# Altium schematic symbol library Блоки трансформаторов импульсных.SCHLIB: 325 symbols (part 1 of 2) (continued)
## БТИ2-10 (continued)
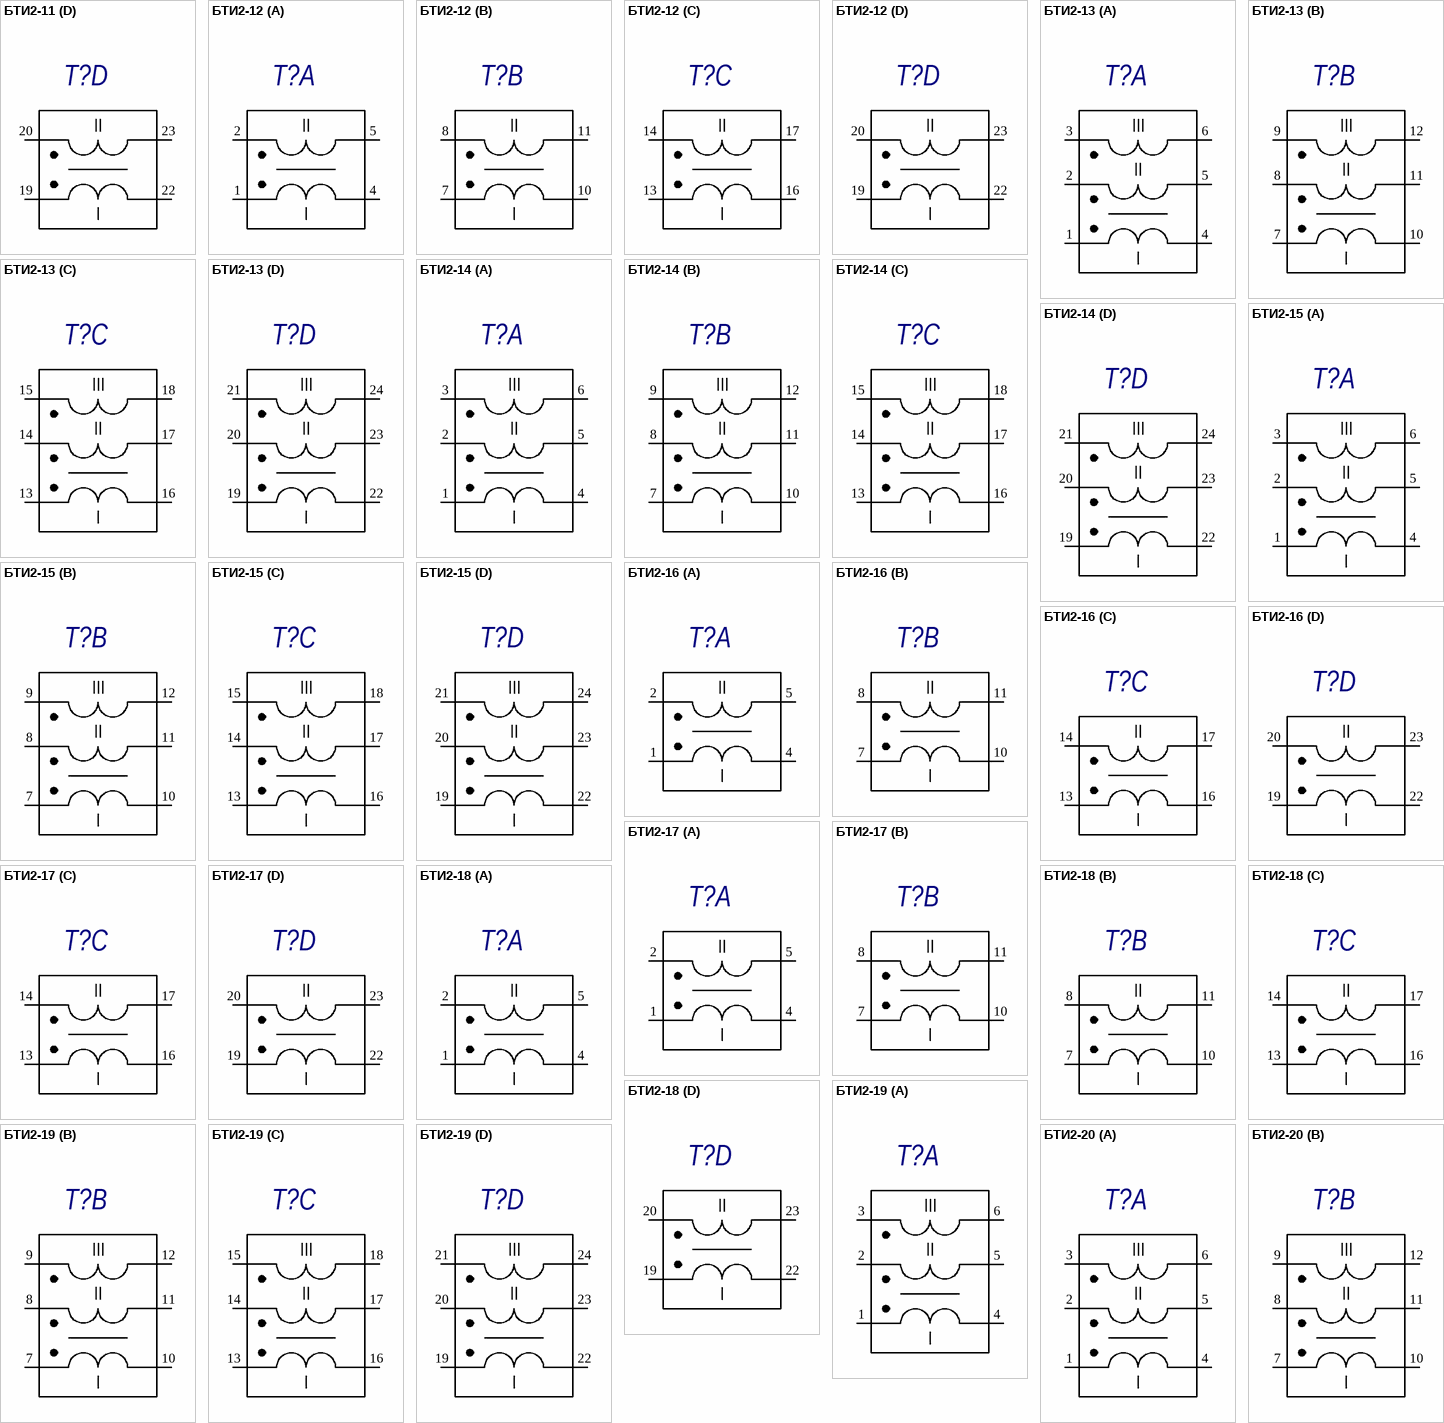
[diagram p5: symbols БТИ2-11 to БТИ2-20]
part A text: II; I
part B text: II; I
part C text: II; I
part D text: II; I

## БТИ2-11
designator T?
БТИ2; Manufacturer: ПАО  «МСТАТОР»; ManufacturerCountry: Россия; Value: {Value}; Наименование элемента: Дроссель; Category: Трансформатор; ComponentLink1Description: Manufacturer Link
footprint БТИ2
part A pins: 1, 2, 4, 5
part B pins: 7, 8, 10, 11
part C pins: 13, 14, 16, 17
part D pins: 19, 20, 22, 23
part A text: II; I
part B text: II; I
part C text: II; I
part D text: II; I

## БТИ2-12
designator T?
БТИ2; Manufacturer: ПАО  «МСТАТОР»; ManufacturerCountry: Россия; Value: {Value}; Наименование элемента: Дроссель; Category: Трансформатор; ComponentLink1Description: Manufacturer Link
footprint БТИ2
part A pins: 1, 2, 4, 5
part B pins: 7, 8, 10, 11
part C pins: 13, 14, 16, 17
part D pins: 19, 20, 22, 23
part A text: II; I
part B text: II; I
part C text: II; I
part D text: II; I

## БТИ2-13
designator T?
БТИ2; Manufacturer: ПАО  «МСТАТОР»; ManufacturerCountry: Россия; Value: {Value}; Наименование элемента: Дроссель; Category: Трансформатор; ComponentLink1Description: Manufacturer Link
footprint БТИ2
part A pins: 1, 2, 3, 4, 5, 6
part B pins: 7, 8, 9, 10, 11, 12
part C pins: 13, 14, 15, 16, 17, 18
part D pins: 19, 20, 21, 22, 23, 24
part A text: III; II; I
part B text: III; II; I
part C text: III; II; I
part D text: III; II; I

## БТИ2-14
designator T?
БТИ2; Manufacturer: ПАО  «МСТАТОР»; ManufacturerCountry: Россия; Value: {Value}; Наименование элемента: Дроссель; Category: Трансформатор; ComponentLink1Description: Manufacturer Link
footprint БТИ2
part A pins: 1, 2, 3, 4, 5, 6
part B pins: 7, 8, 9, 10, 11, 12
part C pins: 13, 14, 15, 16, 17, 18
part D pins: 19, 20, 21, 22, 23, 24
part A text: III; II; I
part B text: III; II; I
part C text: III; II; I
part D text: III; II; I

## БТИ2-15
designator T?
БТИ2; Manufacturer: ПАО  «МСТАТОР»; ManufacturerCountry: Россия; Value: {Value}; Наименование элемента: Дроссель; Category: Трансформатор; ComponentLink1Description: Manufacturer Link
footprint БТИ2
part A pins: 1, 2, 3, 4, 5, 6
part B pins: 7, 8, 9, 10, 11, 12
part C pins: 13, 14, 15, 16, 17, 18
part D pins: 19, 20, 21, 22, 23, 24
part A text: III; II; I
part B text: III; II; I
part C text: III; II; I
part D text: III; II; I

## БТИ2-16
designator T?
БТИ2; Manufacturer: ПАО  «МСТАТОР»; ManufacturerCountry: Россия; Value: {Value}; Наименование элемента: Дроссель; Category: Трансформатор; ComponentLink1Description: Manufacturer Link
footprint БТИ2
part A pins: 1, 2, 4, 5
part B pins: 7, 8, 10, 11
part C pins: 13, 14, 16, 17
part D pins: 19, 20, 22, 23
part A text: II; I
part B text: II; I
part C text: II; I
part D text: II; I

## БТИ2-17
designator T?
БТИ2; Manufacturer: ПАО  «МСТАТОР»; ManufacturerCountry: Россия; Value: {Value}; Наименование элемента: Дроссель; Category: Трансформатор; ComponentLink1Description: Manufacturer Link
footprint БТИ2
part A pins: 1, 2, 4, 5
part B pins: 7, 8, 10, 11
part C pins: 13, 14, 16, 17
part D pins: 19, 20, 22, 23
part A text: II; I
part B text: II; I
part C text: II; I
part D text: II; I

## БТИ2-18
designator T?
БТИ2; Manufacturer: ПАО  «МСТАТОР»; ManufacturerCountry: Россия; Value: {Value}; Наименование элемента: Дроссель; Category: Трансформатор; ComponentLink1Description: Manufacturer Link
footprint БТИ2
part A pins: 1, 2, 4, 5
part B pins: 7, 8, 10, 11
part C pins: 13, 14, 16, 17
part D pins: 19, 20, 22, 23
part A text: II; I
part B text: II; I
part C text: II; I
part D text: II; I

## БТИ2-19
designator T?
БТИ2; Manufacturer: ПАО  «МСТАТОР»; ManufacturerCountry: Россия; Value: {Value}; Наименование элемента: Дроссель; Category: Трансформатор; ComponentLink1Description: Manufacturer Link
footprint БТИ2
part A pins: 1, 2, 3, 4, 5, 6
part B pins: 7, 8, 9, 10, 11, 12
part C pins: 13, 14, 15, 16, 17, 18
part D pins: 19, 20, 21, 22, 23, 24
part A text: III; II; I
part B text: III; II; I
part C text: III; II; I
part D text: III; II; I

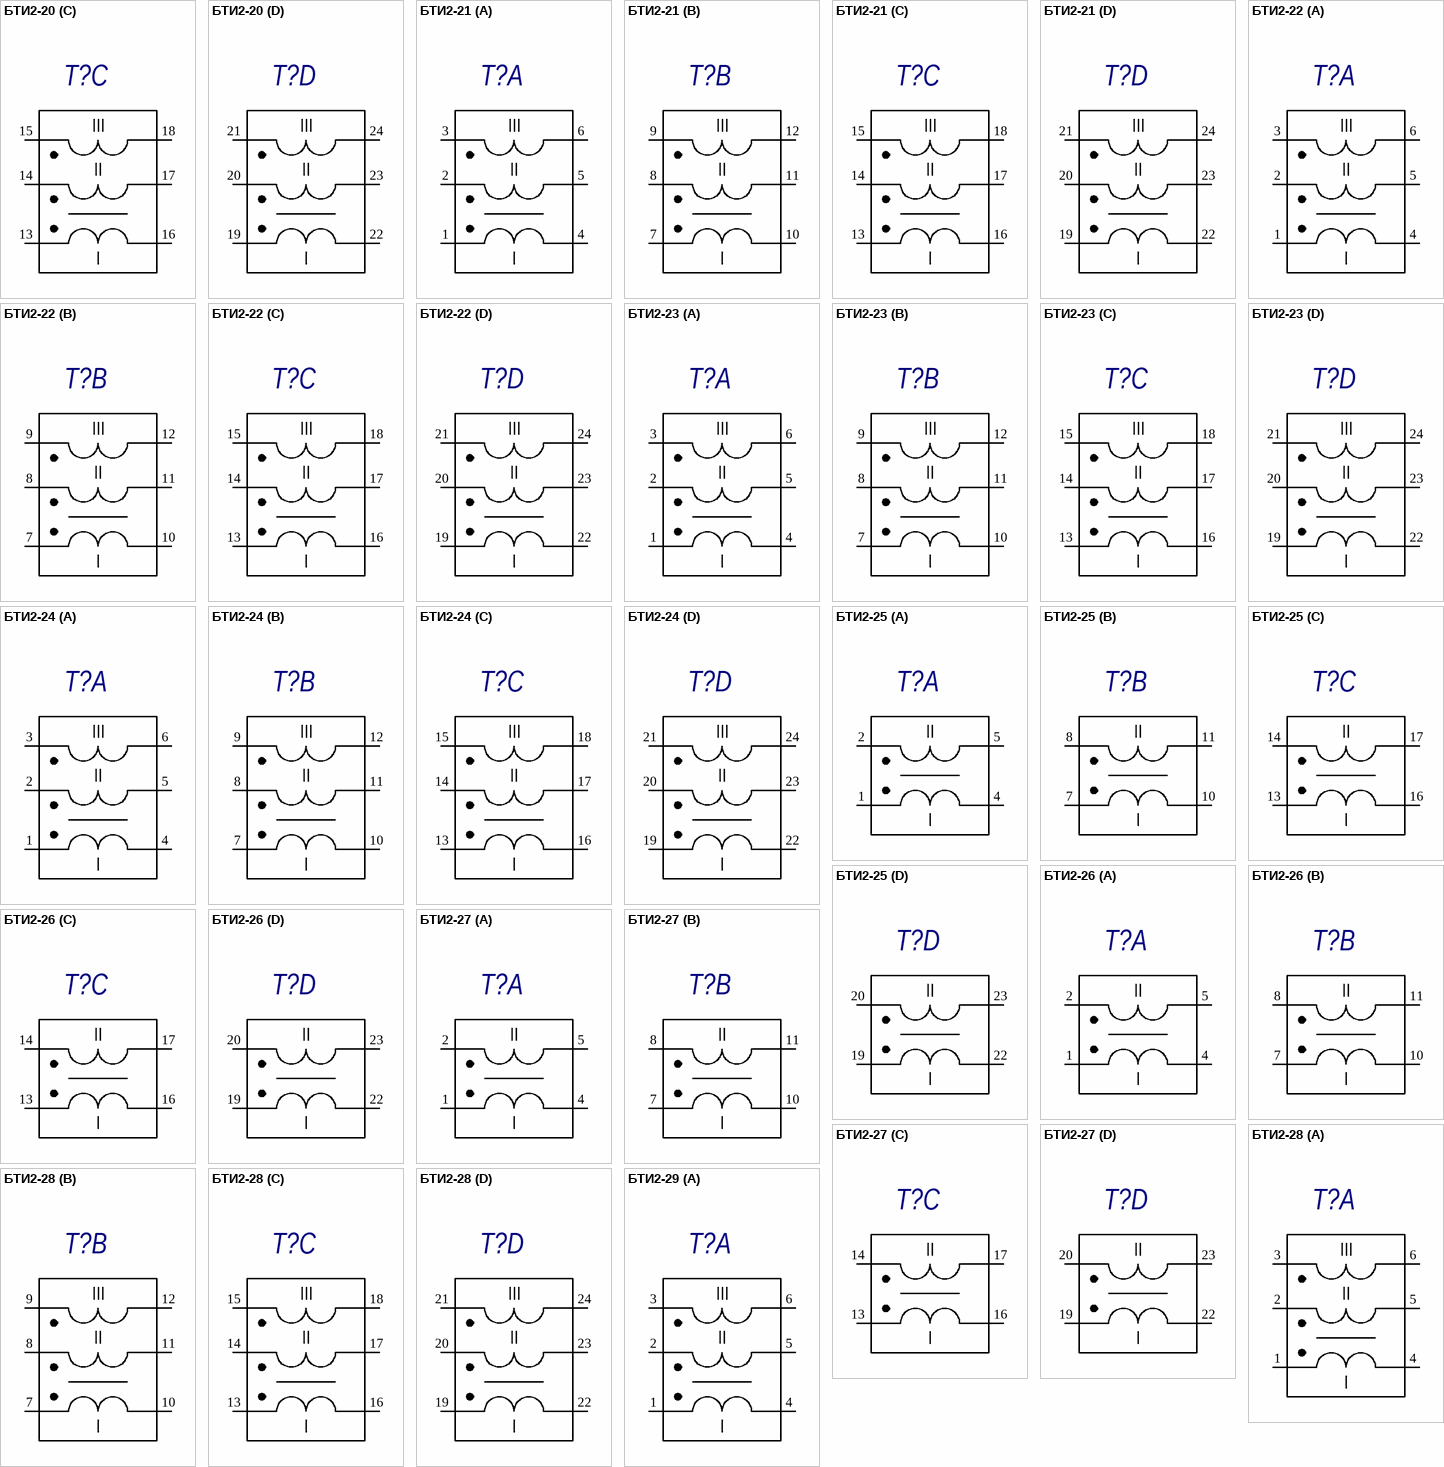
[diagram p6: symbols БТИ2-20 to БТИ2-29]

## БТИ2-20
designator T?
БТИ2; Manufacturer: ПАО  «МСТАТОР»; ManufacturerCountry: Россия; Value: {Value}; Наименование элемента: Дроссель; Category: Трансформатор; ComponentLink1Description: Manufacturer Link
footprint БТИ2
part A pins: 1, 2, 3, 4, 5, 6
part B pins: 7, 8, 9, 10, 11, 12
part C pins: 13, 14, 15, 16, 17, 18
part D pins: 19, 20, 21, 22, 23, 24
part A text: III; II; I
part B text: III; II; I
part C text: III; II; I
part D text: III; II; I

## БТИ2-21
designator T?
БТИ2; Manufacturer: ПАО  «МСТАТОР»; ManufacturerCountry: Россия; Value: {Value}; Наименование элемента: Дроссель; Category: Трансформатор; ComponentLink1Description: Manufacturer Link
footprint БТИ2
part A pins: 1, 2, 3, 4, 5, 6
part B pins: 7, 8, 9, 10, 11, 12
part C pins: 13, 14, 15, 16, 17, 18
part D pins: 19, 20, 21, 22, 23, 24
part A text: III; II; I
part B text: III; II; I
part C text: III; II; I
part D text: III; II; I

## БТИ2-22
designator T?
БТИ2; Manufacturer: ПАО  «МСТАТОР»; ManufacturerCountry: Россия; Value: {Value}; Наименование элемента: Дроссель; Category: Трансформатор; ComponentLink1Description: Manufacturer Link
footprint БТИ2
part A pins: 1, 2, 3, 4, 5, 6
part B pins: 7, 8, 9, 10, 11, 12
part C pins: 13, 14, 15, 16, 17, 18
part D pins: 19, 20, 21, 22, 23, 24
part A text: III; II; I
part B text: III; II; I
part C text: III; II; I
part D text: III; II; I

## БТИ2-23
designator T?
БТИ2; Manufacturer: ПАО  «МСТАТОР»; ManufacturerCountry: Россия; Value: {Value}; Наименование элемента: Дроссель; Category: Трансформатор; ComponentLink1Description: Manufacturer Link
footprint БТИ2
part A pins: 1, 2, 3, 4, 5, 6
part B pins: 7, 8, 9, 10, 11, 12
part C pins: 13, 14, 15, 16, 17, 18
part D pins: 19, 20, 21, 22, 23, 24
part A text: III; II; I
part B text: III; II; I
part C text: III; II; I
part D text: III; II; I

## БТИ2-24
designator T?
БТИ2; Manufacturer: ПАО  «МСТАТОР»; ManufacturerCountry: Россия; Value: {Value}; Наименование элемента: Дроссель; Category: Трансформатор; ComponentLink1Description: Manufacturer Link
footprint БТИ2
part A pins: 1, 2, 3, 4, 5, 6
part B pins: 7, 8, 9, 10, 11, 12
part C pins: 13, 14, 15, 16, 17, 18
part D pins: 19, 20, 21, 22, 23, 24
part A text: III; II; I
part B text: III; II; I
part C text: III; II; I
part D text: III; II; I

## БТИ2-25
designator T?
БТИ2; Manufacturer: ПАО  «МСТАТОР»; ManufacturerCountry: Россия; Value: {Value}; Наименование элемента: Дроссель; Category: Трансформатор; ComponentLink1Description: Manufacturer Link
footprint БТИ2
part A pins: 1, 2, 4, 5
part B pins: 7, 8, 10, 11
part C pins: 13, 14, 16, 17
part D pins: 19, 20, 22, 23
part A text: II; I
part B text: II; I
part C text: II; I
part D text: II; I

## БТИ2-26
designator T?
БТИ2; Manufacturer: ПАО  «МСТАТОР»; ManufacturerCountry: Россия; Value: {Value}; Наименование элемента: Дроссель; Category: Трансформатор; ComponentLink1Description: Manufacturer Link
footprint БТИ2
part A pins: 1, 2, 4, 5
part B pins: 7, 8, 10, 11
part C pins: 13, 14, 16, 17
part D pins: 19, 20, 22, 23
part A text: II; I
part B text: II; I
part C text: II; I
part D text: II; I

## БТИ2-27
designator T?
БТИ2; Manufacturer: ПАО  «МСТАТОР»; ManufacturerCountry: Россия; Value: {Value}; Наименование элемента: Дроссель; Category: Трансформатор; ComponentLink1Description: Manufacturer Link
footprint БТИ2
part A pins: 1, 2, 4, 5
part B pins: 7, 8, 10, 11
part C pins: 13, 14, 16, 17
part D pins: 19, 20, 22, 23
part A text: II; I
part B text: II; I
part C text: II; I
part D text: II; I

## БТИ2-28
designator T?
БТИ2; Manufacturer: ПАО  «МСТАТОР»; ManufacturerCountry: Россия; Value: {Value}; Наименование элемента: Дроссель; Category: Трансформатор; ComponentLink1Description: Manufacturer Link
footprint БТИ2
part A pins: 1, 2, 3, 4, 5, 6
part B pins: 7, 8, 9, 10, 11, 12
part C pins: 13, 14, 15, 16, 17, 18
part D pins: 19, 20, 21, 22, 23, 24
part A text: III; II; I
part B text: III; II; I
part C text: III; II; I
part D text: III; II; I

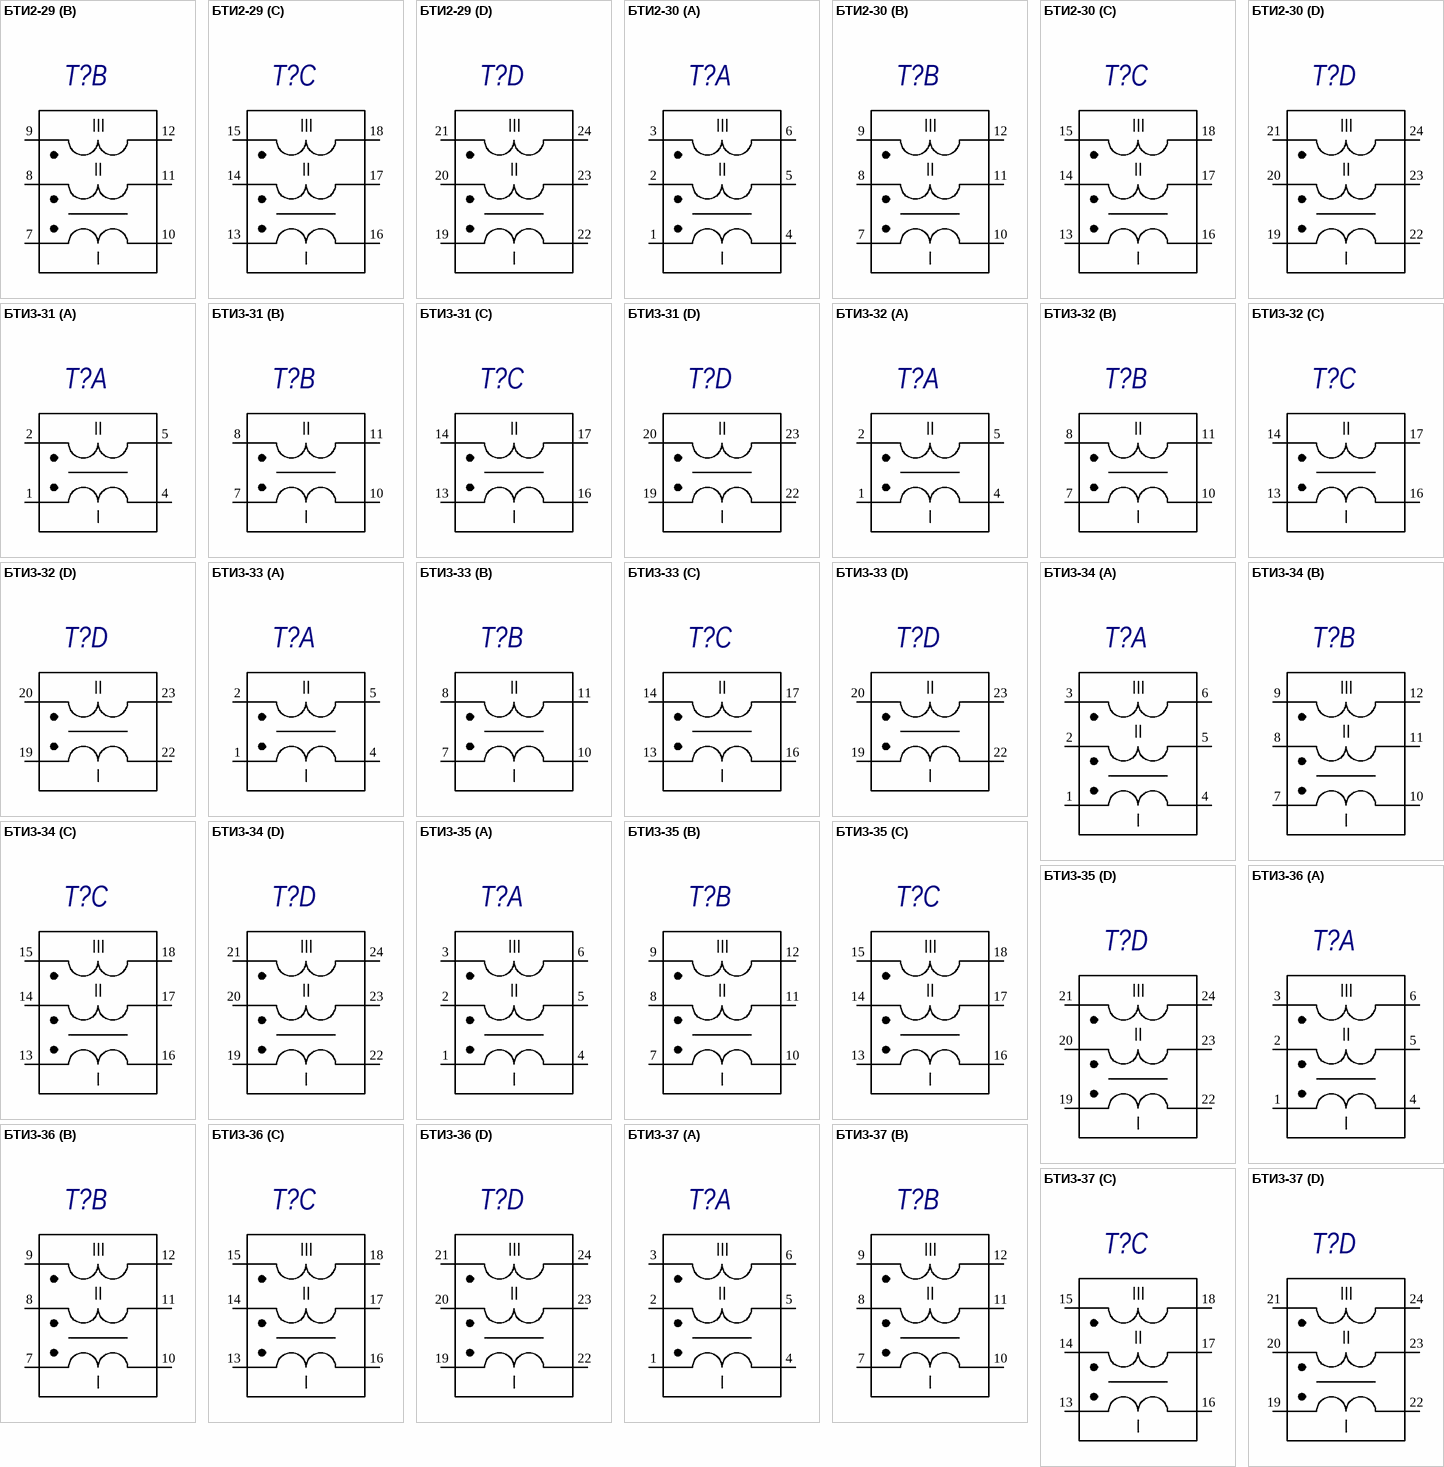
[diagram p7: symbols БТИ2-29 to БТИ3-37]

## БТИ2-29
designator T?
БТИ2; Manufacturer: ПАО  «МСТАТОР»; ManufacturerCountry: Россия; Value: {Value}; Наименование элемента: Дроссель; Category: Трансформатор; ComponentLink1Description: Manufacturer Link
footprint БТИ2
part A pins: 1, 2, 3, 4, 5, 6
part B pins: 7, 8, 9, 10, 11, 12
part C pins: 13, 14, 15, 16, 17, 18
part D pins: 19, 20, 21, 22, 23, 24
part A text: III; II; I
part B text: III; II; I
part C text: III; II; I
part D text: III; II; I

## БТИ2-30
designator T?
БТИ2; Manufacturer: ПАО  «МСТАТОР»; ManufacturerCountry: Россия; Value: {Value}; Наименование элемента: Дроссель; Category: Трансформатор; ComponentLink1Description: Manufacturer Link
footprint БТИ2
part A pins: 1, 2, 3, 4, 5, 6
part B pins: 7, 8, 9, 10, 11, 12
part C pins: 13, 14, 15, 16, 17, 18
part D pins: 19, 20, 21, 22, 23, 24
part A text: III; II; I
part B text: III; II; I
part C text: III; II; I
part D text: III; II; I

## БТИ3-31
designator T?
БТИ3; Manufacturer: ПАО  «МСТАТОР»; ManufacturerCountry: Россия; Value: {Value}; Наименование элемента: Дроссель; Category: Трансформатор; ComponentLink1Description: Manufacturer Link
footprint БТИ3
part A pins: 1, 2, 4, 5
part B pins: 7, 8, 10, 11
part C pins: 13, 14, 16, 17
part D pins: 19, 20, 22, 23
part A text: II; I
part B text: II; I
part C text: II; I
part D text: II; I

## БТИ3-32
designator T?
БТИ3; Manufacturer: ПАО  «МСТАТОР»; ManufacturerCountry: Россия; Value: {Value}; Наименование элемента: Дроссель; Category: Трансформатор; ComponentLink1Description: Manufacturer Link
footprint БТИ3
part A pins: 1, 2, 4, 5
part B pins: 7, 8, 10, 11
part C pins: 13, 14, 16, 17
part D pins: 19, 20, 22, 23
part A text: II; I
part B text: II; I
part C text: II; I
part D text: II; I

## БТИ3-33
designator T?
БТИ3; Manufacturer: ПАО  «МСТАТОР»; ManufacturerCountry: Россия; Value: {Value}; Наименование элемента: Дроссель; Category: Трансформатор; ComponentLink1Description: Manufacturer Link
footprint БТИ3
part A pins: 1, 2, 4, 5
part B pins: 7, 8, 10, 11
part C pins: 13, 14, 16, 17
part D pins: 19, 20, 22, 23
part A text: II; I
part B text: II; I
part C text: II; I
part D text: II; I

## БТИ3-34
designator T?
БТИ3; Manufacturer: ПАО  «МСТАТОР»; ManufacturerCountry: Россия; Value: {Value}; Наименование элемента: Дроссель; Category: Трансформатор; ComponentLink1Description: Manufacturer Link
footprint БТИ3
part A pins: 1, 2, 3, 4, 5, 6
part B pins: 7, 8, 9, 10, 11, 12
part C pins: 13, 14, 15, 16, 17, 18
part D pins: 19, 20, 21, 22, 23, 24
part A text: III; II; I
part B text: III; II; I
part C text: III; II; I
part D text: III; II; I

## БТИ3-35
designator T?
БТИ3; Manufacturer: ПАО  «МСТАТОР»; ManufacturerCountry: Россия; Value: {Value}; Наименование элемента: Дроссель; Category: Трансформатор; ComponentLink1Description: Manufacturer Link
footprint БТИ3
part A pins: 1, 2, 3, 4, 5, 6
part B pins: 7, 8, 9, 10, 11, 12
part C pins: 13, 14, 15, 16, 17, 18
part D pins: 19, 20, 21, 22, 23, 24
part A text: III; II; I
part B text: III; II; I
part C text: III; II; I
part D text: III; II; I

## БТИ3-36
designator T?
БТИ3; Manufacturer: ПАО  «МСТАТОР»; ManufacturerCountry: Россия; Value: {Value}; Наименование элемента: Дроссель; Category: Трансформатор; ComponentLink1Description: Manufacturer Link
footprint БТИ3
part A pins: 1, 2, 3, 4, 5, 6
part B pins: 7, 8, 9, 10, 11, 12
part C pins: 13, 14, 15, 16, 17, 18
part D pins: 19, 20, 21, 22, 23, 24
part A text: III; II; I
part B text: III; II; I
part C text: III; II; I
part D text: III; II; I

## БТИ3-37
designator T?
БТИ3; Manufacturer: ПАО  «МСТАТОР»; ManufacturerCountry: Россия; Value: {Value}; Наименование элемента: Дроссель; Category: Трансформатор; ComponentLink1Description: Manufacturer Link
footprint БТИ3
part A pins: 1, 2, 3, 4, 5, 6
part B pins: 7, 8, 9, 10, 11, 12
part C pins: 13, 14, 15, 16, 17, 18
part D pins: 19, 20, 21, 22, 23, 24
part A text: III; II; I
part B text: III; II; I
part C text: III; II; I
part D text: III; II; I

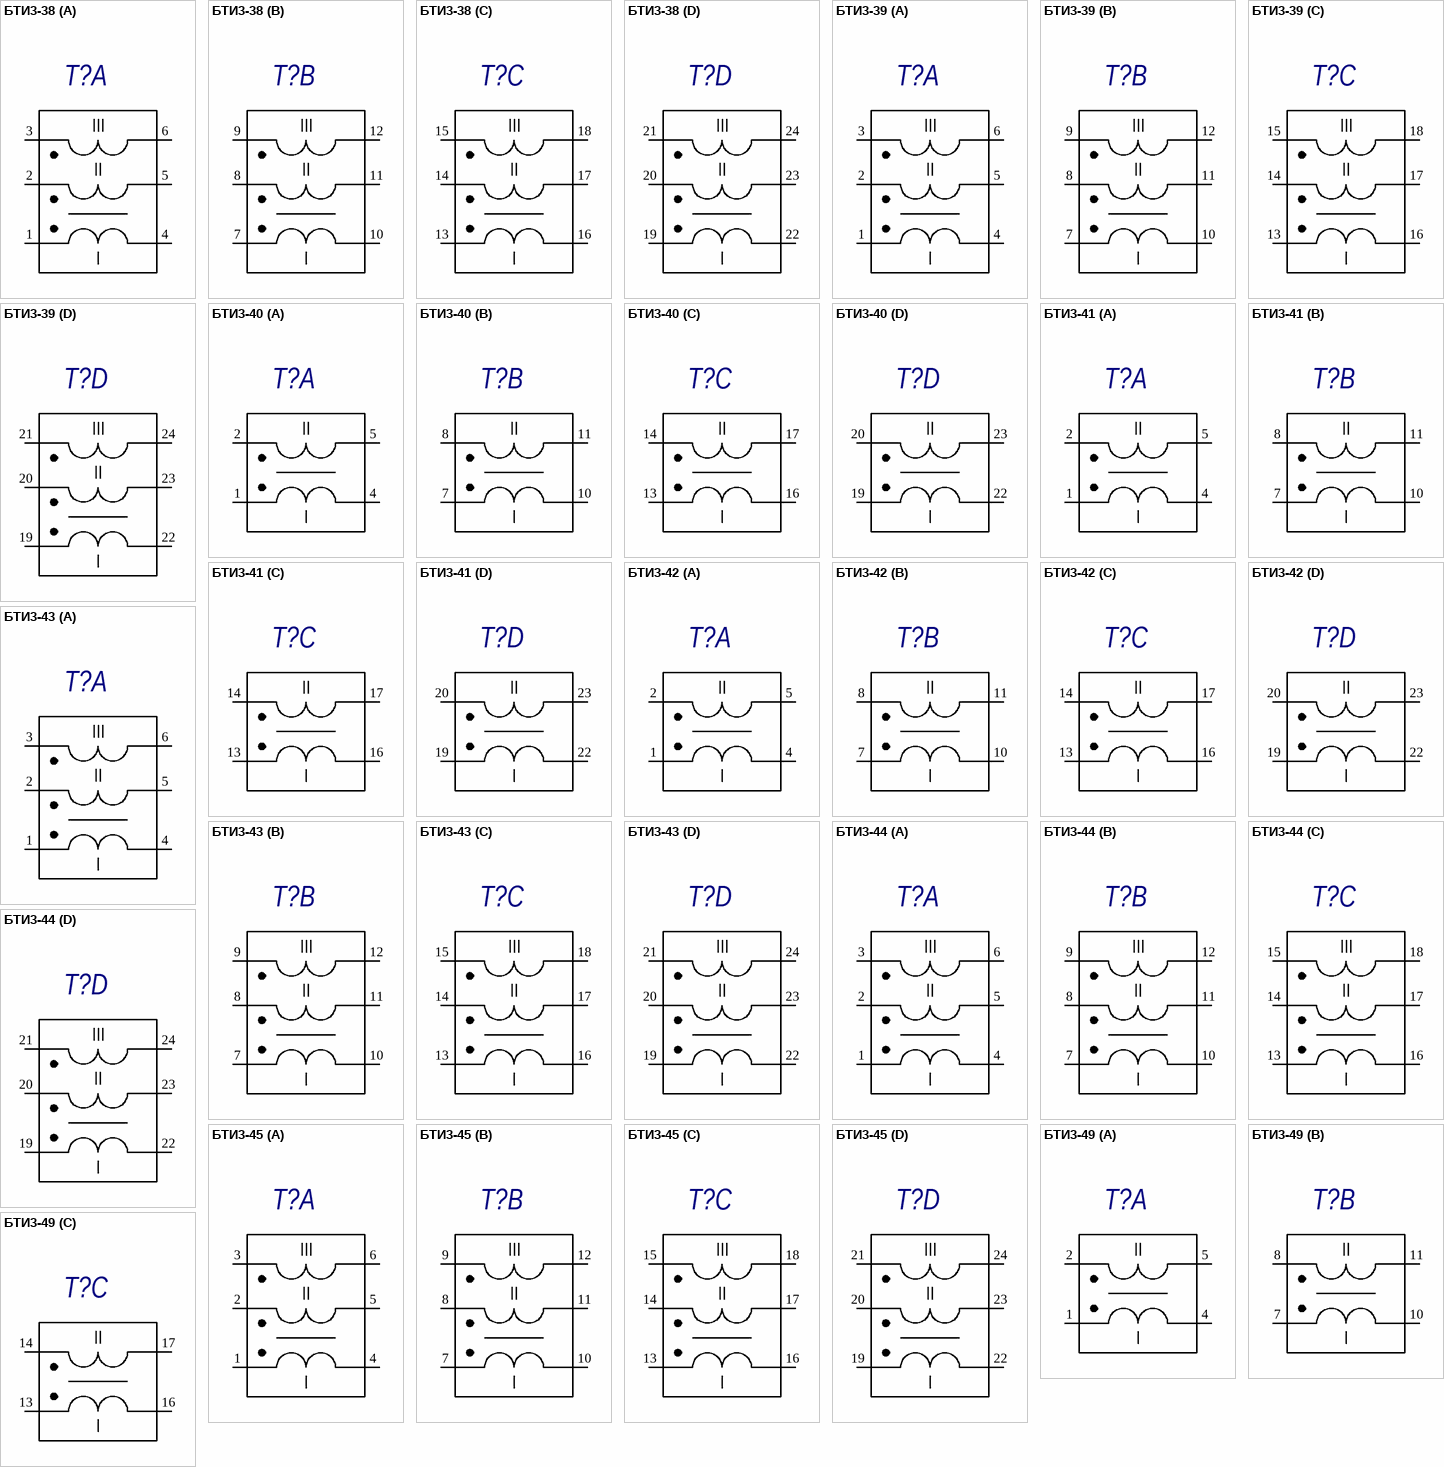
[diagram p8: symbols БТИ3-38 to БТИ3-49]

## БТИ3-38
designator T?
БТИ3; Manufacturer: ПАО  «МСТАТОР»; ManufacturerCountry: Россия; Value: {Value}; Наименование элемента: Дроссель; Category: Трансформатор; ComponentLink1Description: Manufacturer Link
footprint БТИ3
part A pins: 1, 2, 3, 4, 5, 6
part B pins: 7, 8, 9, 10, 11, 12
part C pins: 13, 14, 15, 16, 17, 18
part D pins: 19, 20, 21, 22, 23, 24
part A text: III; II; I
part B text: III; II; I
part C text: III; II; I
part D text: III; II; I

## БТИ3-39
designator T?
БТИ3; Manufacturer: ПАО  «МСТАТОР»; ManufacturerCountry: Россия; Value: {Value}; Наименование элемента: Дроссель; Category: Трансформатор; ComponentLink1Description: Manufacturer Link
footprint БТИ3
part A pins: 1, 2, 3, 4, 5, 6
part B pins: 7, 8, 9, 10, 11, 12
part C pins: 13, 14, 15, 16, 17, 18
part D pins: 19, 20, 21, 22, 23, 24
part A text: III; II; I
part B text: III; II; I
part C text: III; II; I
part D text: III; II; I

## БТИ3-40
designator T?
БТИ3; Manufacturer: ПАО  «МСТАТОР»; ManufacturerCountry: Россия; Value: {Value}; Наименование элемента: Дроссель; Category: Трансформатор; ComponentLink1Description: Manufacturer Link
footprint БТИ3
part A pins: 1, 2, 4, 5
part B pins: 7, 8, 10, 11
part C pins: 13, 14, 16, 17
part D pins: 19, 20, 22, 23
part A text: II; I
part B text: II; I
part C text: II; I
part D text: II; I

## БТИ3-41
designator T?
БТИ3; Manufacturer: ПАО  «МСТАТОР»; ManufacturerCountry: Россия; Value: {Value}; Наименование элемента: Дроссель; Category: Трансформатор; ComponentLink1Description: Manufacturer Link
footprint БТИ3
part A pins: 1, 2, 4, 5
part B pins: 7, 8, 10, 11
part C pins: 13, 14, 16, 17
part D pins: 19, 20, 22, 23
part A text: II; I
part B text: II; I
part C text: II; I
part D text: II; I

## БТИ3-42
designator T?
БТИ3; Manufacturer: ПАО  «МСТАТОР»; ManufacturerCountry: Россия; Value: {Value}; Наименование элемента: Дроссель; Category: Трансформатор; ComponentLink1Description: Manufacturer Link
footprint БТИ3
part A pins: 1, 2, 4, 5
part B pins: 7, 8, 10, 11
part C pins: 13, 14, 16, 17
part D pins: 19, 20, 22, 23
part A text: II; I
part B text: II; I
part C text: II; I
part D text: II; I

## БТИ3-43
designator T?
БТИ3; Manufacturer: ПАО  «МСТАТОР»; ManufacturerCountry: Россия; Value: {Value}; Наименование элемента: Дроссель; Category: Трансформатор; ComponentLink1Description: Manufacturer Link
footprint БТИ3
part A pins: 1, 2, 3, 4, 5, 6
part B pins: 7, 8, 9, 10, 11, 12
part C pins: 13, 14, 15, 16, 17, 18
part D pins: 19, 20, 21, 22, 23, 24
part A text: III; II; I
part B text: III; II; I
part C text: III; II; I
part D text: III; II; I

## БТИ3-44
designator T?
БТИ3; Manufacturer: ПАО  «МСТАТОР»; ManufacturerCountry: Россия; Value: {Value}; Наименование элемента: Дроссель; Category: Трансформатор; ComponentLink1Description: Manufacturer Link
footprint БТИ3
part A pins: 1, 2, 3, 4, 5, 6
part B pins: 7, 8, 9, 10, 11, 12
part C pins: 13, 14, 15, 16, 17, 18
part D pins: 19, 20, 21, 22, 23, 24
part A text: III; II; I
part B text: III; II; I
part C text: III; II; I
part D text: III; II; I

## БТИ3-45
designator T?
БТИ3; Manufacturer: ПАО  «МСТАТОР»; ManufacturerCountry: Россия; Value: {Value}; Наименование элемента: Дроссель; Category: Трансформатор; ComponentLink1Description: Manufacturer Link
footprint БТИ3
part A pins: 1, 2, 3, 4, 5, 6
part B pins: 7, 8, 9, 10, 11, 12
part C pins: 13, 14, 15, 16, 17, 18
part D pins: 19, 20, 21, 22, 23, 24
part A text: III; II; I
part B text: III; II; I
part C text: III; II; I
part D text: III; II; I

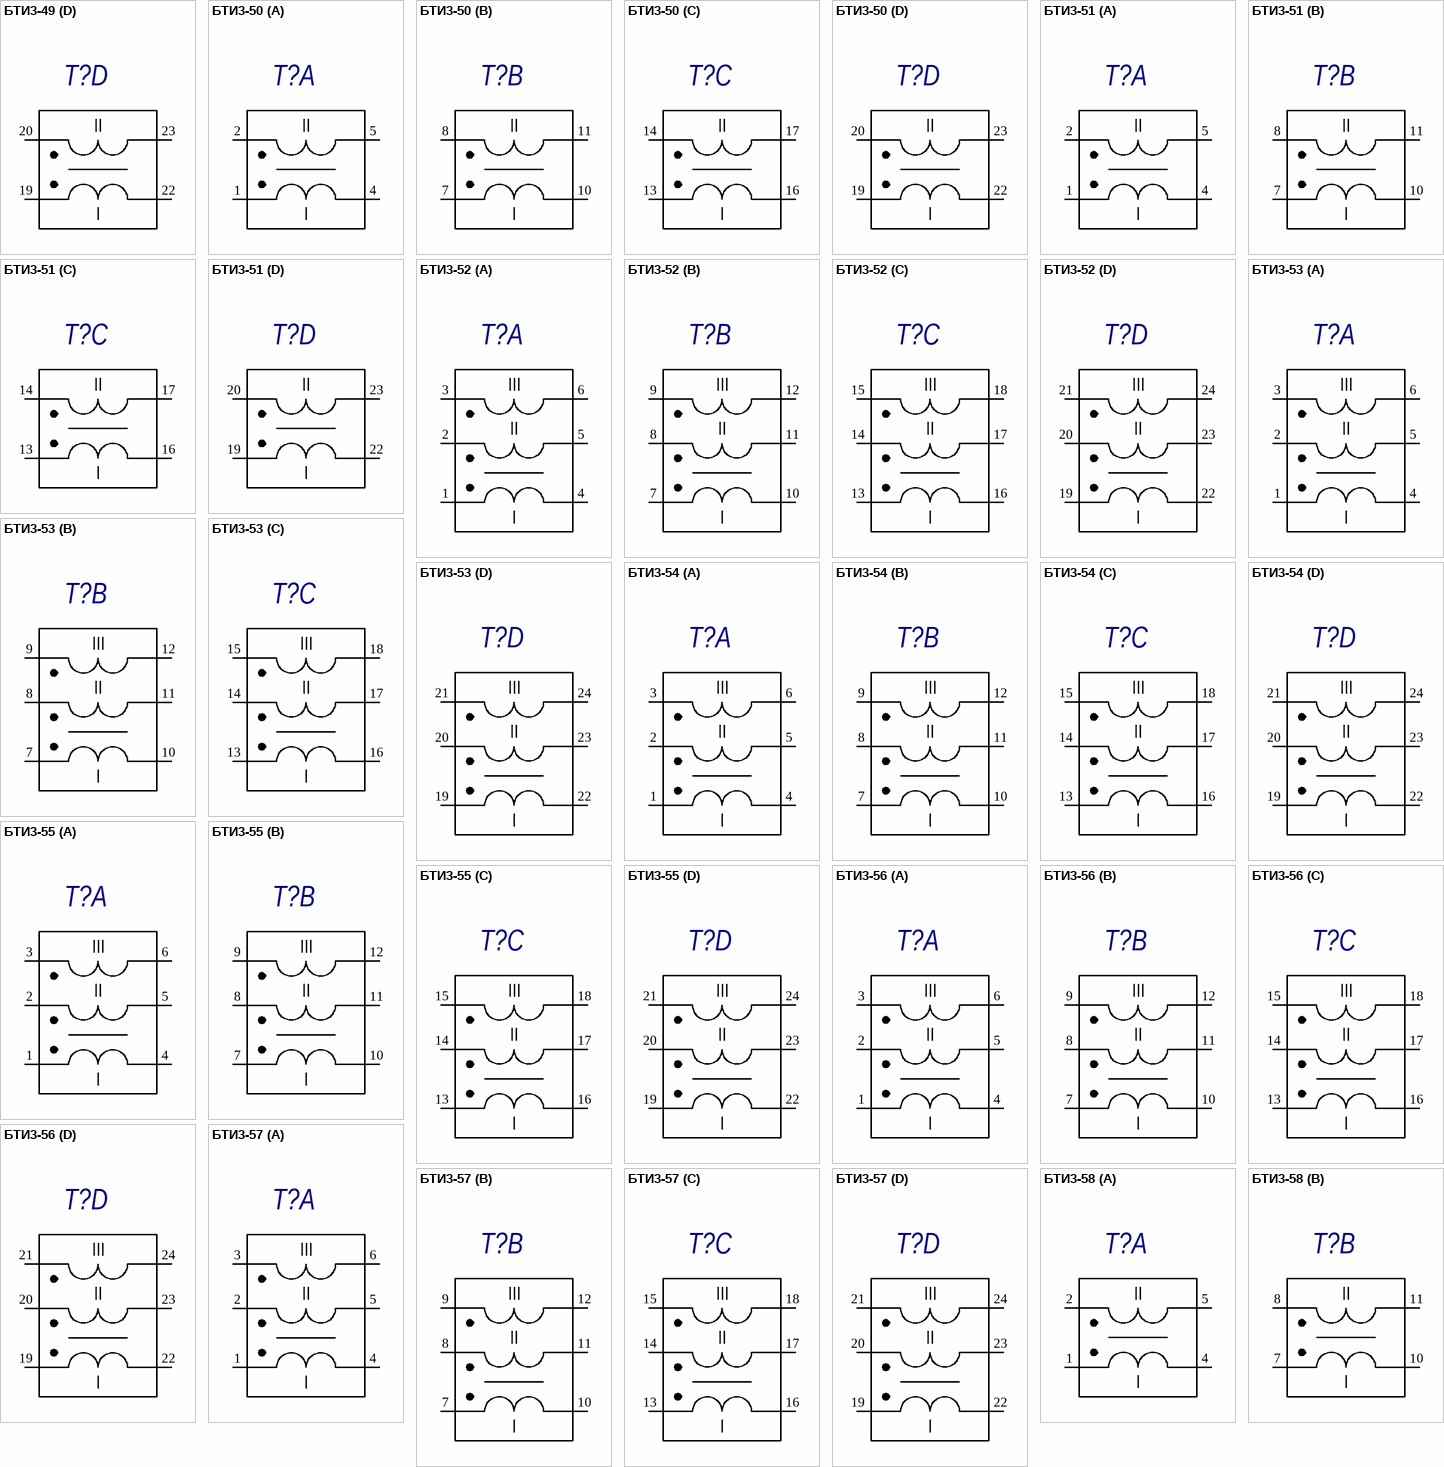
[diagram p9: symbols БТИ3-49 to БТИ3-58]

## БТИ3-49
designator T?
БТИ3; Manufacturer: ПАО  «МСТАТОР»; ManufacturerCountry: Россия; Value: {Value}; Наименование элемента: Дроссель; Category: Трансформатор; ComponentLink1Description: Manufacturer Link
footprint БТИ3
part A pins: 1, 2, 4, 5
part B pins: 7, 8, 10, 11
part C pins: 13, 14, 16, 17
part D pins: 19, 20, 22, 23
part A text: II; I
part B text: II; I
part C text: II; I
part D text: II; I

## БТИ3-50
designator T?
БТИ3; Manufacturer: ПАО  «МСТАТОР»; ManufacturerCountry: Россия; Value: {Value}; Наименование элемента: Дроссель; Category: Трансформатор; ComponentLink1Description: Manufacturer Link
footprint БТИ3
part A pins: 1, 2, 4, 5
part B pins: 7, 8, 10, 11
part C pins: 13, 14, 16, 17
part D pins: 19, 20, 22, 23
part A text: II; I
part B text: II; I
part C text: II; I
part D text: II; I

## БТИ3-51
designator T?
БТИ3; Manufacturer: ПАО  «МСТАТОР»; ManufacturerCountry: Россия; Value: {Value}; Наименование элемента: Дроссель; Category: Трансформатор; ComponentLink1Description: Manufacturer Link
footprint БТИ3
part A pins: 1, 2, 4, 5
part B pins: 7, 8, 10, 11
part C pins: 13, 14, 16, 17
part D pins: 19, 20, 22, 23
part A text: II; I
part B text: II; I
part C text: II; I
part D text: II; I

## БТИ3-52
designator T?
БТИ3; Manufacturer: ПАО  «МСТАТОР»; ManufacturerCountry: Россия; Value: {Value}; Наименование элемента: Дроссель; Category: Трансформатор; ComponentLink1Description: Manufacturer Link
footprint БТИ3
part A pins: 1, 2, 3, 4, 5, 6
part B pins: 7, 8, 9, 10, 11, 12
part C pins: 13, 14, 15, 16, 17, 18
part D pins: 19, 20, 21, 22, 23, 24
part A text: III; II; I
part B text: III; II; I
part C text: III; II; I
part D text: III; II; I

## БТИ3-53
designator T?
БТИ3; Manufacturer: ПАО  «МСТАТОР»; ManufacturerCountry: Россия; Value: {Value}; Наименование элемента: Дроссель; Category: Трансформатор; ComponentLink1Description: Manufacturer Link
footprint БТИ3
part A pins: 1, 2, 3, 4, 5, 6
part B pins: 7, 8, 9, 10, 11, 12
part C pins: 13, 14, 15, 16, 17, 18
part D pins: 19, 20, 21, 22, 23, 24
part A text: III; II; I
part B text: III; II; I
part C text: III; II; I
part D text: III; II; I

## БТИ3-54
designator T?
БТИ3; Manufacturer: ПАО  «МСТАТОР»; ManufacturerCountry: Россия; Value: {Value}; Наименование элемента: Дроссель; Category: Трансформатор; ComponentLink1Description: Manufacturer Link
footprint БТИ3
part A pins: 1, 2, 3, 4, 5, 6
part B pins: 7, 8, 9, 10, 11, 12
part C pins: 13, 14, 15, 16, 17, 18
part D pins: 19, 20, 21, 22, 23, 24
part A text: III; II; I
part B text: III; II; I
part C text: III; II; I
part D text: III; II; I

## БТИ3-55
designator T?
БТИ3; Manufacturer: ПАО  «МСТАТОР»; ManufacturerCountry: Россия; Value: {Value}; Наименование элемента: Дроссель; Category: Трансформатор; ComponentLink1Description: Manufacturer Link
footprint БТИ3
part A pins: 1, 2, 3, 4, 5, 6
part B pins: 7, 8, 9, 10, 11, 12
part C pins: 13, 14, 15, 16, 17, 18
part D pins: 19, 20, 21, 22, 23, 24
part A text: III; II; I
part B text: III; II; I
part C text: III; II; I
part D text: III; II; I

## БТИ3-56
designator T?
БТИ3; Manufacturer: ПАО  «МСТАТОР»; ManufacturerCountry: Россия; Value: {Value}; Наименование элемента: Дроссель; Category: Трансформатор; ComponentLink1Description: Manufacturer Link
footprint БТИ3
part A pins: 1, 2, 3, 4, 5, 6
part B pins: 7, 8, 9, 10, 11, 12
part C pins: 13, 14, 15, 16, 17, 18
part D pins: 19, 20, 21, 22, 23, 24
part A text: III; II; I
part B text: III; II; I
part C text: III; II; I
part D text: III; II; I

## БТИ3-57
designator T?
БТИ3; Manufacturer: ПАО  «МСТАТОР»; ManufacturerCountry: Россия; Value: {Value}; Наименование элемента: Дроссель; Category: Трансформатор; ComponentLink1Description: Manufacturer Link
footprint БТИ3
part A pins: 1, 2, 3, 4, 5, 6
part B pins: 7, 8, 9, 10, 11, 12
part C pins: 13, 14, 15, 16, 17, 18
part D pins: 19, 20, 21, 22, 23, 24
part A text: III; II; I
part B text: III; II; I
part C text: III; II; I
part D text: III; II; I

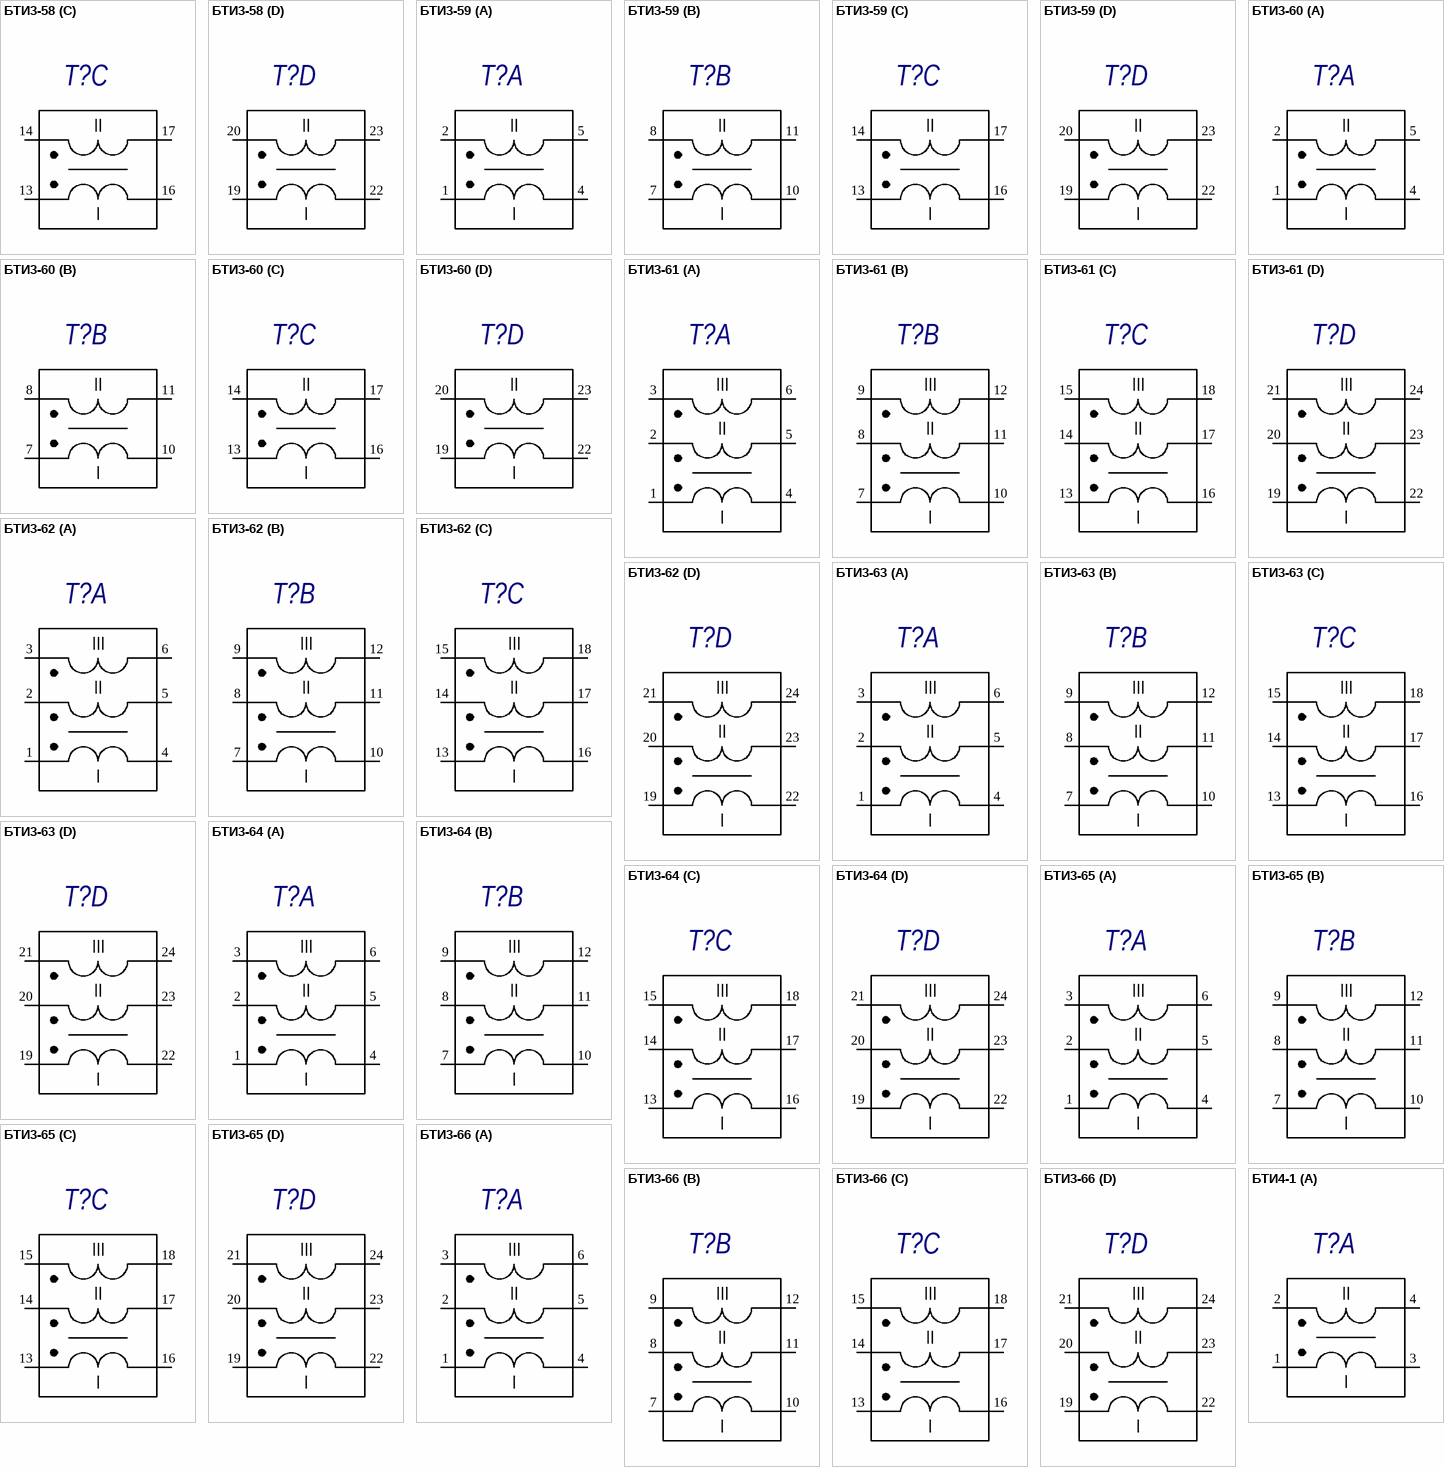
[diagram p10: symbols БТИ3-58 to БТИ4-1]

## БТИ3-58
designator T?
БТИ3; Manufacturer: ПАО  «МСТАТОР»; ManufacturerCountry: Россия; Value: {Value}; Наименование элемента: Дроссель; Category: Трансформатор; ComponentLink1Description: Manufacturer Link
footprint БТИ3
part A pins: 1, 2, 4, 5
part B pins: 7, 8, 10, 11
part C pins: 13, 14, 16, 17
part D pins: 19, 20, 22, 23
part A text: II; I
part B text: II; I
part C text: II; I
part D text: II; I

## БТИ3-59
designator T?
БТИ3; Manufacturer: ПАО  «МСТАТОР»; ManufacturerCountry: Россия; Value: {Value}; Наименование элемента: Дроссель; Category: Трансформатор; ComponentLink1Description: Manufacturer Link
footprint БТИ3
part A pins: 1, 2, 4, 5
part B pins: 7, 8, 10, 11
part C pins: 13, 14, 16, 17
part D pins: 19, 20, 22, 23
part A text: II; I
part B text: II; I
part C text: II; I
part D text: II; I

## БТИ3-60
designator T?
БТИ3; Manufacturer: ПАО  «МСТАТОР»; ManufacturerCountry: Россия; Value: {Value}; Наименование элемента: Дроссель; Category: Трансформатор; ComponentLink1Description: Manufacturer Link
footprint БТИ3
part A pins: 1, 2, 4, 5
part B pins: 7, 8, 10, 11
part C pins: 13, 14, 16, 17
part D pins: 19, 20, 22, 23
part A text: II; I
part B text: II; I
part C text: II; I
part D text: II; I

## БТИ3-61
designator T?
БТИ3; Manufacturer: ПАО  «МСТАТОР»; ManufacturerCountry: Россия; Value: {Value}; Наименование элемента: Дроссель; Category: Трансформатор; ComponentLink1Description: Manufacturer Link
footprint БТИ3
part A pins: 1, 2, 3, 4, 5, 6
part B pins: 7, 8, 9, 10, 11, 12
part C pins: 13, 14, 15, 16, 17, 18
part D pins: 19, 20, 21, 22, 23, 24
part A text: III; II; I
part B text: III; II; I
part C text: III; II; I
part D text: III; II; I

## БТИ3-62
designator T?
БТИ3; Manufacturer: ПАО  «МСТАТОР»; ManufacturerCountry: Россия; Value: {Value}; Наименование элемента: Дроссель; Category: Трансформатор; ComponentLink1Description: Manufacturer Link
footprint БТИ3
part A pins: 1, 2, 3, 4, 5, 6
part B pins: 7, 8, 9, 10, 11, 12
part C pins: 13, 14, 15, 16, 17, 18
part D pins: 19, 20, 21, 22, 23, 24
part A text: III; II; I
part B text: III; II; I
part C text: III; II; I
part D text: III; II; I

## БТИ3-63
designator T?
БТИ3; Manufacturer: ПАО  «МСТАТОР»; ManufacturerCountry: Россия; Value: {Value}; Наименование элемента: Дроссель; Category: Трансформатор; ComponentLink1Description: Manufacturer Link
footprint БТИ3
part A pins: 1, 2, 3, 4, 5, 6
part B pins: 7, 8, 9, 10, 11, 12
part C pins: 13, 14, 15, 16, 17, 18
part D pins: 19, 20, 21, 22, 23, 24
part A text: III; II; I
part B text: III; II; I
part C text: III; II; I
part D text: III; II; I

## БТИ3-64
designator T?
БТИ3; Manufacturer: ПАО  «МСТАТОР»; ManufacturerCountry: Россия; Value: {Value}; Наименование элемента: Дроссель; Category: Трансформатор; ComponentLink1Description: Manufacturer Link
footprint БТИ3
part A pins: 1, 2, 3, 4, 5, 6
part B pins: 7, 8, 9, 10, 11, 12
part C pins: 13, 14, 15, 16, 17, 18
part D pins: 19, 20, 21, 22, 23, 24
part A text: III; II; I
part B text: III; II; I
part C text: III; II; I
part D text: III; II; I

## БТИ3-65
designator T?
БТИ3; Manufacturer: ПАО  «МСТАТОР»; ManufacturerCountry: Россия; Value: {Value}; Наименование элемента: Дроссель; Category: Трансформатор; ComponentLink1Description: Manufacturer Link
footprint БТИ3
part A pins: 1, 2, 3, 4, 5, 6
part B pins: 7, 8, 9, 10, 11, 12
part C pins: 13, 14, 15, 16, 17, 18
part D pins: 19, 20, 21, 22, 23, 24
part A text: III; II; I
part B text: III; II; I
part C text: III; II; I
part D text: III; II; I

## БТИ3-66
designator T?
БТИ3; Manufacturer: ПАО  «МСТАТОР»; ManufacturerCountry: Россия; Value: {Value}; Наименование элемента: Дроссель; Category: Трансформатор; ComponentLink1Description: Manufacturer Link
footprint БТИ3
part A pins: 1, 2, 3, 4, 5, 6
part B pins: 7, 8, 9, 10, 11, 12
part C pins: 13, 14, 15, 16, 17, 18
part D pins: 19, 20, 21, 22, 23, 24
